# Altium schematic symbol library jlcpcb_2025_04_capacitors_extended_0402.schlib: 3594 symbols (part 15 of 20)
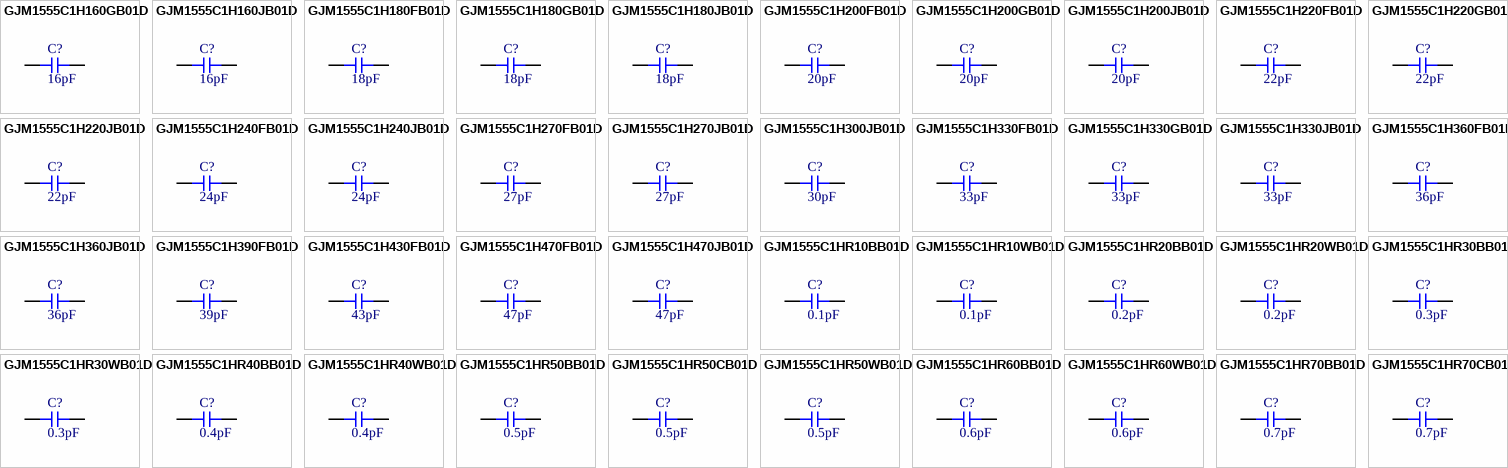
[diagram p103: symbols GJM1555C1H160GB01D to GJM1555C1HR70CB01D]

## GJM1555C1HR70CB01D
designator C?  Capacitance: 0.7pF  (hidden comment: *)
Capacitor, Ceramic (MLCC), 0.7pF, 50V, C0G, SMD 0402; Manufacturer: Murata Electronics; Manufacturer Part Number: GJM1555C1HR70CB01D; Package Size: 0402; JLCPCB Basic Part: No; JLCPCB Part Number: C344021; Supplier 1: LCSC; Category: Capacitors - MLCC; Supplier Part Number 1: C344021; Voltage Rating: 50V; Temperature Coefficient: C0G; RoHS: Yes; ComponentLink1Description: Datasheet; ComponentLink1URL: https://wmsc.lcsc.com/wmsc/upload/file/pdf/v2/lcsc/1912111437_Murata-Electronics-GJM1555C1HR70CB01D_C344021.pdf; ComponentLink2Description: JLCPCB Part URL; ComponentLink2URL: https://jlcpcb.com/partdetail/C344021; ComponentLink3Description: LCSC Part URL; ComponentLink3URL: https://lcsc.com/product-detail/Multilayer-Ceramic-Capacitors-MLCC---SMD-SMT_Murata-Electronics-Murata-Electronics-GJM1555C1HR70CB01D_C344021.html
footprint CAP-0402 (0402 (1005M) Capacitor)
pins: 1, 2

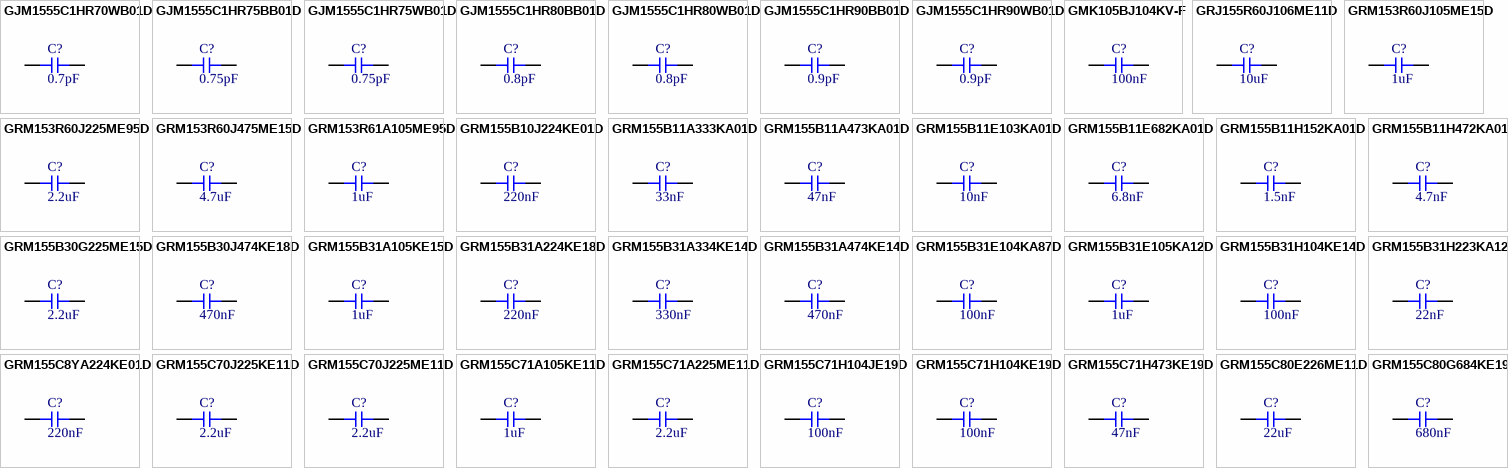
[diagram p65: symbols GJM1555C1HR70WB01D to GRM155C80G684KE19D]

## GJM1555C1HR70WB01D
designator C?  Capacitance: 0.7pF  (hidden comment: *)
Capacitor, Ceramic (MLCC), 0.7pF, 50V, C0G, SMD 0402; Manufacturer: Murata Electronics; Manufacturer Part Number: GJM1555C1HR70WB01D; Package Size: 0402; JLCPCB Basic Part: No; JLCPCB Part Number: C397301; Supplier 1: LCSC; Category: Capacitors - MLCC; Supplier Part Number 1: C397301; Voltage Rating: 50V; Temperature Coefficient: C0G; RoHS: Yes; ComponentLink1Description: Datasheet; ComponentLink1URL: https://wmsc.lcsc.com/wmsc/upload/file/pdf/v2/lcsc/1912111437_Murata-Electronics-GJM1555C1HR70WB01D_C397301.pdf; ComponentLink2Description: JLCPCB Part URL; ComponentLink2URL: https://jlcpcb.com/partdetail/C397301; ComponentLink3Description: LCSC Part URL; ComponentLink3URL: https://lcsc.com/product-detail/Multilayer-Ceramic-Capacitors-MLCC---SMD-SMT_Murata-Electronics-Murata-Electronics-GJM1555C1HR70WB01D_C397301.html
footprint CAP-0402 (0402 (1005M) Capacitor)
pins: 1, 2

## GJM1555C1HR75BB01D
designator C?  Capacitance: 0.75pF  (hidden comment: *)
Capacitor, Ceramic (MLCC), 0.75pF, 50V, C0G, SMD 0402; Manufacturer: Murata Electronics; Manufacturer Part Number: GJM1555C1HR75BB01D; Package Size: 0402; JLCPCB Basic Part: No; JLCPCB Part Number: C2931057; Supplier 1: LCSC; Category: Capacitors - MLCC; Supplier Part Number 1: C2931057; Voltage Rating: 50V; Temperature Coefficient: C0G; RoHS: Yes; ComponentLink1Description: Datasheet; ComponentLink1URL: https://wmsc.lcsc.com/wmsc/upload/file/pdf/v2/lcsc/2202161830_Murata-Electronics-GJM1555C1HR75BB01D_C2931057.pdf; ComponentLink2Description: JLCPCB Part URL; ComponentLink2URL: https://jlcpcb.com/partdetail/C2931057; ComponentLink3Description: LCSC Part URL; ComponentLink3URL: https://lcsc.com/product-detail/Multilayer-Ceramic-Capacitors-MLCC---SMD-SMT_Murata-Electronics-Murata-Electronics-GJM1555C1HR75BB01D_C2931057.html
footprint CAP-0402 (0402 (1005M) Capacitor)
pins: 1, 2

## GJM1555C1HR75WB01D
designator C?  Capacitance: 0.75pF  (hidden comment: *)
Capacitor, Ceramic (MLCC), 0.75pF, 50V, C0G, SMD 0402; Manufacturer: Murata Electronics; Manufacturer Part Number: GJM1555C1HR75WB01D; Package Size: 0402; JLCPCB Basic Part: No; JLCPCB Part Number: C76914; Supplier 1: LCSC; Category: Capacitors - MLCC; Supplier Part Number 1: C76914; Voltage Rating: 50V; Temperature Coefficient: C0G; RoHS: Yes; ComponentLink1Description: Datasheet; ComponentLink1URL: https://wmsc.lcsc.com/wmsc/upload/file/pdf/v2/lcsc/1811081611_Murata-Electronics-GJM1555C1HR75WB01D_C76914.pdf; ComponentLink2Description: JLCPCB Part URL; ComponentLink2URL: https://jlcpcb.com/partdetail/C76914; ComponentLink3Description: LCSC Part URL; ComponentLink3URL: https://lcsc.com/product-detail/Multilayer-Ceramic-Capacitors-MLCC---SMD-SMT_Murata-Electronics-Murata-Electronics-GJM1555C1HR75WB01D_C76914.html
footprint CAP-0402 (0402 (1005M) Capacitor)
pins: 1, 2

## GJM1555C1HR80BB01D
designator C?  Capacitance: 0.8pF  (hidden comment: *)
Capacitor, Ceramic (MLCC), 0.8pF, 50V, C0G, SMD 0402; Manufacturer: Murata Electronics; Manufacturer Part Number: GJM1555C1HR80BB01D; Package Size: 0402; JLCPCB Basic Part: No; JLCPCB Part Number: C76915; Supplier 1: LCSC; Category: Capacitors - MLCC; Supplier Part Number 1: C76915; Voltage Rating: 50V; Temperature Coefficient: C0G; RoHS: Yes; ComponentLink1Description: Datasheet; ComponentLink1URL: https://wmsc.lcsc.com/wmsc/upload/file/pdf/v2/lcsc/1811081610_Murata-Electronics-GJM1555C1HR80BB01D_C76915.pdf; ComponentLink2Description: JLCPCB Part URL; ComponentLink2URL: https://jlcpcb.com/partdetail/C76915; ComponentLink3Description: LCSC Part URL; ComponentLink3URL: https://lcsc.com/product-detail/Multilayer-Ceramic-Capacitors-MLCC---SMD-SMT_Murata-Electronics-Murata-Electronics-GJM1555C1HR80BB01D_C76915.html
footprint CAP-0402 (0402 (1005M) Capacitor)
pins: 1, 2

## GJM1555C1HR80WB01D
designator C?  Capacitance: 0.8pF  (hidden comment: *)
Capacitor, Ceramic (MLCC), 0.8pF, 50V, C0G, SMD 0402; Manufacturer: Murata Electronics; Manufacturer Part Number: GJM1555C1HR80WB01D; Package Size: 0402; JLCPCB Basic Part: No; JLCPCB Part Number: C88902; Supplier 1: LCSC; Category: Capacitors - MLCC; Supplier Part Number 1: C88902; Voltage Rating: 50V; Temperature Coefficient: C0G; RoHS: Yes; ComponentLink1Description: Datasheet; ComponentLink1URL: https://wmsc.lcsc.com/wmsc/upload/file/pdf/v2/lcsc/2304140030_Murata-Electronics-GJM1555C1HR80WB01D_C88902.pdf; ComponentLink2Description: JLCPCB Part URL; ComponentLink2URL: https://jlcpcb.com/partdetail/C88902; ComponentLink3Description: LCSC Part URL; ComponentLink3URL: https://lcsc.com/product-detail/Multilayer-Ceramic-Capacitors-MLCC---SMD-SMT_Murata-Electronics-Murata-Electronics-GJM1555C1HR80WB01D_C88902.html
footprint CAP-0402 (0402 (1005M) Capacitor)
pins: 1, 2

## GJM1555C1HR90BB01D
designator C?  Capacitance: 0.9pF  (hidden comment: *)
Capacitor, Ceramic (MLCC), 0.9pF, null, null, SMD 0402; Manufacturer: Murata Electronics; Manufacturer Part Number: GJM1555C1HR90BB01D; Package Size: 0402; JLCPCB Basic Part: No; JLCPCB Part Number: C882556; Supplier 1: LCSC; Category: Capacitors - MLCC; Supplier Part Number 1: C882556; Voltage Rating: null; Temperature Coefficient: null; RoHS: Yes; ComponentLink1Description: Datasheet; ComponentLink1URL: https://wmsc.lcsc.com/wmsc/upload/file/pdf/v2/lcsc/2201242130_Murata-Electronics-GJM1555C1HR90BB01D_C882556.pdf; ComponentLink2Description: JLCPCB Part URL; ComponentLink2URL: https://jlcpcb.com/partdetail/C882556; ComponentLink3Description: LCSC Part URL; ComponentLink3URL: https://lcsc.com/product-detail/Multilayer-Ceramic-Capacitors-MLCC---SMD-SMT_Murata-Electronics-Murata-Electronics-GJM1555C1HR90BB01D_C882556.html
footprint CAP-0402 (0402 (1005M) Capacitor)
pins: 1, 2

## GJM1555C1HR90WB01D
designator C?  Capacitance: 0.9pF  (hidden comment: *)
Capacitor, Ceramic (MLCC), 0.9pF, 50V, C0G, SMD 0402; Manufacturer: Murata Electronics; Manufacturer Part Number: GJM1555C1HR90WB01D; Package Size: 0402; JLCPCB Basic Part: No; JLCPCB Part Number: C161350; Supplier 1: LCSC; Category: Capacitors - MLCC; Supplier Part Number 1: C161350; Voltage Rating: 50V; Temperature Coefficient: C0G; RoHS: Yes; ComponentLink1Description: Datasheet; ComponentLink1URL: https://wmsc.lcsc.com/wmsc/upload/file/pdf/v2/lcsc/1811081513_Murata-Electronics-GJM1555C1HR90WB01D_C161350.pdf; ComponentLink2Description: JLCPCB Part URL; ComponentLink2URL: https://jlcpcb.com/partdetail/C161350; ComponentLink3Description: LCSC Part URL; ComponentLink3URL: https://lcsc.com/product-detail/Multilayer-Ceramic-Capacitors-MLCC---SMD-SMT_Murata-Electronics-Murata-Electronics-GJM1555C1HR90WB01D_C161350.html
footprint CAP-0402 (0402 (1005M) Capacitor)
pins: 1, 2

## GMK105BJ104KV-F
designator C?  Capacitance: 100nF  (hidden comment: *)
Capacitor, Ceramic (MLCC), 100nF, ±10%, 35V, X5R, ±10%, SMD 0402; Manufacturer: Taiyo Yuden; Manufacturer Part Number: GMK105BJ104KV-F; Package Size: 0402; JLCPCB Basic Part: No; JLCPCB Part Number: C187828; Supplier 1: LCSC; Category: Capacitors - MLCC; Supplier Part Number 1: C187828; Tolerance: ±10%; Voltage Rating: 35V; Temperature Coefficient: X5R; RoHS: Yes; ComponentLink1Description: Datasheet; ComponentLink1URL: https://wmsc.lcsc.com/wmsc/upload/file/pdf/v2/lcsc/2211282300_Taiyo-Yuden-GMK105BJ104KV-F_C187828.pdf; ComponentLink2Description: JLCPCB Part URL; ComponentLink2URL: https://jlcpcb.com/partdetail/C187828; ComponentLink3Description: LCSC Part URL; ComponentLink3URL: https://lcsc.com/product-detail/Multilayer-Ceramic-Capacitors-MLCC---SMD-SMT_Taiyo-Yuden-Taiyo-Yuden-GMK105BJ104KV-F_C187828.html
footprint CAP-0402 (0402 (1005M) Capacitor)
pins: 1, 2

## GRJ155R60J106ME11D
designator C?  Capacitance: 10uF  (hidden comment: *)
Capacitor, Ceramic (MLCC), 10uF, ±20%, 6.3V, X5R, ±20%, SMD 0402; Manufacturer: Murata Electronics; Manufacturer Part Number: GRJ155R60J106ME11D; Package Size: 0402; JLCPCB Basic Part: No; JLCPCB Part Number: C469527; Supplier 1: LCSC; Category: Capacitors - MLCC; Supplier Part Number 1: C469527; Tolerance: ±20%; Voltage Rating: 6.3V; Temperature Coefficient: X5R; RoHS: Yes; ComponentLink1Description: Datasheet; ComponentLink1URL: https://wmsc.lcsc.com/wmsc/upload/file/pdf/v2/lcsc/2304140030_Murata-Electronics-GRJ155R60J106ME11D_C469527.pdf; ComponentLink2Description: JLCPCB Part URL; ComponentLink2URL: https://jlcpcb.com/partdetail/C469527; ComponentLink3Description: LCSC Part URL; ComponentLink3URL: https://lcsc.com/product-detail/Multilayer-Ceramic-Capacitors-MLCC---SMD-SMT_Murata-Electronics-Murata-Electronics-GRJ155R60J106ME11D_C469527.html
footprint CAP-0402 (0402 (1005M) Capacitor)
pins: 1, 2

## GRM153R60J105ME15D
designator C?  Capacitance: 1uF  (hidden comment: *)
Capacitor, Ceramic (MLCC), 1uF, ±20%, 6.3V, X5R, ±20%, SMD 0402; Manufacturer: Murata Electronics; Manufacturer Part Number: GRM153R60J105ME15D; Package Size: 0402; JLCPCB Basic Part: No; JLCPCB Part Number: C335107; Supplier 1: LCSC; Category: Capacitors - MLCC; Supplier Part Number 1: C335107; Tolerance: ±20%; Voltage Rating: 6.3V; Temperature Coefficient: X5R; RoHS: Yes; ComponentLink1Description: Datasheet; ComponentLink1URL: https://wmsc.lcsc.com/wmsc/upload/file/pdf/v2/lcsc/2304140030_Murata-Electronics-GRM153R60J105ME15D_C335107.pdf; ComponentLink2Description: JLCPCB Part URL; ComponentLink2URL: https://jlcpcb.com/partdetail/C335107; ComponentLink3Description: LCSC Part URL; ComponentLink3URL: https://lcsc.com/product-detail/Multilayer-Ceramic-Capacitors-MLCC---SMD-SMT_Murata-Electronics-Murata-Electronics-GRM153R60J105ME15D_C335107.html
footprint CAP-0402 (0402 (1005M) Capacitor)
pins: 1, 2

## GRM153R60J225ME95D
designator C?  Capacitance: 2.2uF  (hidden comment: *)
Capacitor, Ceramic (MLCC), 2.2uF, ±20%, 6.3V, X5R, ±20%, SMD 0402; Manufacturer: Murata Electronics; Manufacturer Part Number: GRM153R60J225ME95D; Package Size: 0402; JLCPCB Basic Part: No; JLCPCB Part Number: C76944; Supplier 1: LCSC; Category: Capacitors - MLCC; Supplier Part Number 1: C76944; Tolerance: ±20%; Voltage Rating: 6.3V; Temperature Coefficient: X5R; RoHS: Yes; ComponentLink1Description: Datasheet; ComponentLink1URL: https://wmsc.lcsc.com/wmsc/upload/file/pdf/v2/lcsc/1811081610_Murata-Electronics-GRM153R60J225ME95D_C76944.pdf; ComponentLink2Description: JLCPCB Part URL; ComponentLink2URL: https://jlcpcb.com/partdetail/C76944; ComponentLink3Description: LCSC Part URL; ComponentLink3URL: https://lcsc.com/product-detail/Multilayer-Ceramic-Capacitors-MLCC---SMD-SMT_Murata-Electronics-Murata-Electronics-GRM153R60J225ME95D_C76944.html
footprint CAP-0402 (0402 (1005M) Capacitor)
pins: 1, 2

## GRM153R60J475ME15D
designator C?  Capacitance: 4.7uF  (hidden comment: *)
Capacitor, Ceramic (MLCC), 4.7uF, ±20%, 6.3V, X5R, ±20%, SMD 0402; Manufacturer: Murata Electronics; Manufacturer Part Number: GRM153R60J475ME15D; Package Size: 0402; JLCPCB Basic Part: No; JLCPCB Part Number: C335104; Supplier 1: LCSC; Category: Capacitors - MLCC; Supplier Part Number 1: C335104; Tolerance: ±20%; Voltage Rating: 6.3V; Temperature Coefficient: X5R; RoHS: Yes; ComponentLink1Description: Datasheet; ComponentLink1URL: https://wmsc.lcsc.com/wmsc/upload/file/pdf/v2/lcsc/2304140030_Murata-Electronics-GRM153R60J475ME15D_C335104.pdf; ComponentLink2Description: JLCPCB Part URL; ComponentLink2URL: https://jlcpcb.com/partdetail/C335104; ComponentLink3Description: LCSC Part URL; ComponentLink3URL: https://lcsc.com/product-detail/Multilayer-Ceramic-Capacitors-MLCC---SMD-SMT_Murata-Electronics-Murata-Electronics-GRM153R60J475ME15D_C335104.html
footprint CAP-0402 (0402 (1005M) Capacitor)
pins: 1, 2

## GRM153R61A105ME95D
designator C?  Capacitance: 1uF  (hidden comment: *)
Capacitor, Ceramic (MLCC), 1uF, ±20%, 10V, X5R, ±20%, SMD 0402; Manufacturer: Murata Electronics; Manufacturer Part Number: GRM153R61A105ME95D; Package Size: 0402; JLCPCB Basic Part: No; JLCPCB Part Number: C2167216; Supplier 1: LCSC; Category: Capacitors - MLCC; Supplier Part Number 1: C2167216; Tolerance: ±20%; Voltage Rating: 10V; Temperature Coefficient: X5R; RoHS: Yes; ComponentLink1Description: Datasheet; ComponentLink1URL: https://wmsc.lcsc.com/wmsc/upload/file/pdf/v2/lcsc/2202040230_Murata-Electronics-GRM153R61A105ME95D_C2167216.pdf; ComponentLink2Description: JLCPCB Part URL; ComponentLink2URL: https://jlcpcb.com/partdetail/C2167216; ComponentLink3Description: LCSC Part URL; ComponentLink3URL: https://lcsc.com/product-detail/Multilayer-Ceramic-Capacitors-MLCC---SMD-SMT_Murata-Electronics-Murata-Electronics-GRM153R61A105ME95D_C2167216.html
footprint CAP-0402 (0402 (1005M) Capacitor)
pins: 1, 2

## GRM155B10J224KE01D
designator C?  Capacitance: 220nF  (hidden comment: *)
Capacitor, Ceramic (MLCC), 220nF, ±10%, 6.3V, B, ±10%, SMD 0402; Manufacturer: Murata Electronics; Manufacturer Part Number: GRM155B10J224KE01D; Package Size: 0402; JLCPCB Basic Part: No; JLCPCB Part Number: C162147; Supplier 1: LCSC; Category: Capacitors - MLCC; Supplier Part Number 1: C162147; Tolerance: ±10%; Voltage Rating: 6.3V; Temperature Coefficient: B; RoHS: Yes; ComponentLink1Description: Datasheet; ComponentLink1URL: https://wmsc.lcsc.com/wmsc/upload/file/pdf/v2/lcsc/1912111437_Murata-Electronics-GRM155B10J224KE01D_C162147.pdf; ComponentLink2Description: JLCPCB Part URL; ComponentLink2URL: https://jlcpcb.com/partdetail/C162147; ComponentLink3Description: LCSC Part URL; ComponentLink3URL: https://lcsc.com/product-detail/Multilayer-Ceramic-Capacitors-MLCC---SMD-SMT_Murata-Electronics-Murata-Electronics-GRM155B10J224KE01D_C162147.html
footprint CAP-0402 (0402 (1005M) Capacitor)
pins: 1, 2

## GRM155B11A333KA01D
designator C?  Capacitance: 33nF  (hidden comment: *)
Capacitor, Ceramic (MLCC), 33nF, ±10%, 10V, B, ±10%, SMD 0402; Manufacturer: Murata Electronics; Manufacturer Part Number: GRM155B11A333KA01D; Package Size: 0402; JLCPCB Basic Part: No; JLCPCB Part Number: C397300; Supplier 1: LCSC; Category: Capacitors - MLCC; Supplier Part Number 1: C397300; Tolerance: ±10%; Voltage Rating: 10V; Temperature Coefficient: B; RoHS: Yes; ComponentLink1Description: Datasheet; ComponentLink1URL: https://wmsc.lcsc.com/wmsc/upload/file/pdf/v2/lcsc/1912111437_Murata-Electronics-GRM155B11A333KA01D_C397300.pdf; ComponentLink2Description: JLCPCB Part URL; ComponentLink2URL: https://jlcpcb.com/partdetail/C397300; ComponentLink3Description: LCSC Part URL; ComponentLink3URL: https://lcsc.com/product-detail/Multilayer-Ceramic-Capacitors-MLCC---SMD-SMT_Murata-Electronics-Murata-Electronics-GRM155B11A333KA01D_C397300.html
footprint CAP-0402 (0402 (1005M) Capacitor)
pins: 1, 2

## GRM155B11A473KA01D
designator C?  Capacitance: 47nF  (hidden comment: *)
Capacitor, Ceramic (MLCC), 47nF, ±10%, 10V, B, ±10%, SMD 0402; Manufacturer: Murata Electronics; Manufacturer Part Number: GRM155B11A473KA01D; Package Size: 0402; JLCPCB Basic Part: No; JLCPCB Part Number: C397296; Supplier 1: LCSC; Category: Capacitors - MLCC; Supplier Part Number 1: C397296; Tolerance: ±10%; Voltage Rating: 10V; Temperature Coefficient: B; RoHS: Yes; ComponentLink1Description: Datasheet; ComponentLink1URL: https://wmsc.lcsc.com/wmsc/upload/file/pdf/v2/lcsc/1912111437_Murata-Electronics-GRM155B11A473KA01D_C397296.pdf; ComponentLink2Description: JLCPCB Part URL; ComponentLink2URL: https://jlcpcb.com/partdetail/C397296; ComponentLink3Description: LCSC Part URL; ComponentLink3URL: https://lcsc.com/product-detail/Multilayer-Ceramic-Capacitors-MLCC---SMD-SMT_Murata-Electronics-Murata-Electronics-GRM155B11A473KA01D_C397296.html
footprint CAP-0402 (0402 (1005M) Capacitor)
pins: 1, 2

## GRM155B11E103KA01D
designator C?  Capacitance: 10nF  (hidden comment: *)
Capacitor, Ceramic (MLCC), 10nF, ±10%, 25V, B, ±10%, SMD 0402; Manufacturer: Murata Electronics; Manufacturer Part Number: GRM155B11E103KA01D; Package Size: 0402; JLCPCB Basic Part: No; JLCPCB Part Number: C85947; Supplier 1: LCSC; Category: Capacitors - MLCC; Supplier Part Number 1: C85947; Tolerance: ±10%; Voltage Rating: 25V; Temperature Coefficient: B; RoHS: Yes; ComponentLink1Description: Datasheet; ComponentLink1URL: https://wmsc.lcsc.com/wmsc/upload/file/pdf/v2/lcsc/2304140030_Murata-Electronics-GRM155B11E103KA01D_C85947.pdf; ComponentLink2Description: JLCPCB Part URL; ComponentLink2URL: https://jlcpcb.com/partdetail/C85947; ComponentLink3Description: LCSC Part URL; ComponentLink3URL: https://lcsc.com/product-detail/Multilayer-Ceramic-Capacitors-MLCC---SMD-SMT_Murata-Electronics-Murata-Electronics-GRM155B11E103KA01D_C85947.html
footprint CAP-0402 (0402 (1005M) Capacitor)
pins: 1, 2

## GRM155B11E682KA01D
designator C?  Capacitance: 6.8nF  (hidden comment: *)
Capacitor, Ceramic (MLCC), 6.8nF, ±10%, 25V, B, ±10%, SMD 0402; Manufacturer: Murata Electronics; Manufacturer Part Number: GRM155B11E682KA01D; Package Size: 0402; JLCPCB Basic Part: No; JLCPCB Part Number: C471372; Supplier 1: LCSC; Category: Capacitors - MLCC; Supplier Part Number 1: C471372; Tolerance: ±10%; Voltage Rating: 25V; Temperature Coefficient: B; RoHS: Yes; ComponentLink1Description: Datasheet; ComponentLink1URL: https://wmsc.lcsc.com/wmsc/upload/file/pdf/v2/lcsc/2308111634_Murata-Electronics-GRM155B11E682KA01D_C471372.pdf; ComponentLink2Description: JLCPCB Part URL; ComponentLink2URL: https://jlcpcb.com/partdetail/C471372; ComponentLink3Description: LCSC Part URL; ComponentLink3URL: https://lcsc.com/product-detail/Multilayer-Ceramic-Capacitors-MLCC---SMD-SMT_Murata-Electronics-Murata-Electronics-GRM155B11E682KA01D_C471372.html
footprint CAP-0402 (0402 (1005M) Capacitor)
pins: 1, 2

## GRM155B11H152KA01D
designator C?  Capacitance: 1.5nF  (hidden comment: *)
Capacitor, Ceramic (MLCC), 1.5nF, ±10%, 50V, ±10%, SMD 0402; Manufacturer: Murata Electronics; Manufacturer Part Number: GRM155B11H152KA01D; Package Size: 0402; JLCPCB Basic Part: No; JLCPCB Part Number: C162152; Supplier 1: LCSC; Category: Capacitors - MLCC; Supplier Part Number 1: C162152; Tolerance: ±10%; Voltage Rating: 50V; RoHS: Yes; ComponentLink1Description: Datasheet; ComponentLink1URL: https://wmsc.lcsc.com/wmsc/upload/file/pdf/v2/lcsc/2109071830_Murata-Electronics-GRM155B11H152KA01D_C162152.pdf; ComponentLink2Description: JLCPCB Part URL; ComponentLink2URL: https://jlcpcb.com/partdetail/C162152; ComponentLink3Description: LCSC Part URL; ComponentLink3URL: https://lcsc.com/product-detail/Multilayer-Ceramic-Capacitors-MLCC---SMD-SMT_Murata-Electronics-Murata-Electronics-GRM155B11H152KA01D_C162152.html
footprint CAP-0402 (0402 (1005M) Capacitor)
pins: 1, 2

## GRM155B11H472KA01D
designator C?  Capacitance: 4.7nF  (hidden comment: *)
Capacitor, Ceramic (MLCC), 4.7nF, ±10%, 50V, B, ±10%, SMD 0402; Manufacturer: Murata Electronics; Manufacturer Part Number: GRM155B11H472KA01D; Package Size: 0402; JLCPCB Basic Part: No; JLCPCB Part Number: C237394; Supplier 1: LCSC; Category: Capacitors - MLCC; Supplier Part Number 1: C237394; Tolerance: ±10%; Voltage Rating: 50V; Temperature Coefficient: B; RoHS: Yes; ComponentLink1Description: Datasheet; ComponentLink1URL: https://wmsc.lcsc.com/wmsc/upload/file/pdf/v2/lcsc/2109071830_Murata-Electronics-GRM155B11H472KA01D_C237394.pdf; ComponentLink2Description: JLCPCB Part URL; ComponentLink2URL: https://jlcpcb.com/partdetail/C237394; ComponentLink3Description: LCSC Part URL; ComponentLink3URL: https://lcsc.com/product-detail/Multilayer-Ceramic-Capacitors-MLCC---SMD-SMT_Murata-Electronics-Murata-Electronics-GRM155B11H472KA01D_C237394.html
footprint CAP-0402 (0402 (1005M) Capacitor)
pins: 1, 2

## GRM155B30G225ME15D
designator C?  Capacitance: 2.2uF  (hidden comment: *)
Capacitor, Ceramic (MLCC), 2.2uF, ±20%, 4V, B, ±20%, SMD 0402; Manufacturer: Murata Electronics; Manufacturer Part Number: GRM155B30G225ME15D; Package Size: 0402; JLCPCB Basic Part: No; JLCPCB Part Number: C415544; Supplier 1: LCSC; Category: Capacitors - MLCC; Supplier Part Number 1: C415544; Tolerance: ±20%; Voltage Rating: 4V; Temperature Coefficient: B; RoHS: Yes; ComponentLink1Description: Datasheet; ComponentLink1URL: https://wmsc.lcsc.com/wmsc/upload/file/pdf/v2/lcsc/2304140030_Murata-Electronics-GRM155B30G225ME15D_C415544.pdf; ComponentLink2Description: JLCPCB Part URL; ComponentLink2URL: https://jlcpcb.com/partdetail/C415544; ComponentLink3Description: LCSC Part URL; ComponentLink3URL: https://lcsc.com/product-detail/Multilayer-Ceramic-Capacitors-MLCC---SMD-SMT_Murata-Electronics-Murata-Electronics-GRM155B30G225ME15D_C415544.html
footprint CAP-0402 (0402 (1005M) Capacitor)
pins: 1, 2

## GRM155B30J474KE18D
designator C?  Capacitance: 470nF  (hidden comment: *)
Capacitor, Ceramic (MLCC), 470nF, ±10%, 6.3V, B, ±10%, SMD 0402; Manufacturer: Murata Electronics; Manufacturer Part Number: GRM155B30J474KE18D; Package Size: 0402; JLCPCB Basic Part: No; JLCPCB Part Number: C524565; Supplier 1: LCSC; Category: Capacitors - MLCC; Supplier Part Number 1: C524565; Tolerance: ±10%; Voltage Rating: 6.3V; Temperature Coefficient: B; RoHS: Yes; ComponentLink1Description: Datasheet; ComponentLink1URL: https://wmsc.lcsc.com/wmsc/upload/file/pdf/v2/lcsc/2008191834_Murata-Electronics-GRM155B30J474KE18D_C524565.pdf; ComponentLink2Description: JLCPCB Part URL; ComponentLink2URL: https://jlcpcb.com/partdetail/C524565; ComponentLink3Description: LCSC Part URL; ComponentLink3URL: https://lcsc.com/product-detail/Multilayer-Ceramic-Capacitors-MLCC---SMD-SMT_Murata-Electronics-Murata-Electronics-GRM155B30J474KE18D_C524565.html
footprint CAP-0402 (0402 (1005M) Capacitor)
pins: 1, 2

## GRM155B31A105KE15D
designator C?  Capacitance: 1uF  (hidden comment: *)
Capacitor, Ceramic (MLCC), 1uF, ±10%, 10V, B, ±10%, SMD 0402; Manufacturer: Murata Electronics; Manufacturer Part Number: GRM155B31A105KE15D; Package Size: 0402; JLCPCB Basic Part: No; JLCPCB Part Number: C162154; Supplier 1: LCSC; Category: Capacitors - MLCC; Supplier Part Number 1: C162154; Tolerance: ±10%; Voltage Rating: 10V; Temperature Coefficient: B; RoHS: Yes; ComponentLink1Description: Datasheet; ComponentLink1URL: https://wmsc.lcsc.com/wmsc/upload/file/pdf/v2/lcsc/2201242300_Murata-Electronics-GRM155B31A105KE15D_C162154.pdf; ComponentLink2Description: JLCPCB Part URL; ComponentLink2URL: https://jlcpcb.com/partdetail/C162154; ComponentLink3Description: LCSC Part URL; ComponentLink3URL: https://lcsc.com/product-detail/Multilayer-Ceramic-Capacitors-MLCC---SMD-SMT_Murata-Electronics-Murata-Electronics-GRM155B31A105KE15D_C162154.html
footprint CAP-0402 (0402 (1005M) Capacitor)
pins: 1, 2

## GRM155B31A224KE18D
designator C?  Capacitance: 220nF  (hidden comment: *)
Capacitor, Ceramic (MLCC), 220nF, ±10%, ±10%, SMD 0402; Manufacturer: Murata Electronics; Manufacturer Part Number: GRM155B31A224KE18D; Package Size: 0402; JLCPCB Basic Part: No; JLCPCB Part Number: C576448; Supplier 1: LCSC; Category: Capacitors - MLCC; Supplier Part Number 1: C576448; Tolerance: ±10%; RoHS: Yes; ComponentLink1Description: Datasheet; ComponentLink1URL: https://wmsc.lcsc.com/wmsc/upload/file/pdf/v2/lcsc/2201131030_Murata-Electronics-GRM155B31A224KE18D_C576448.pdf; ComponentLink2Description: JLCPCB Part URL; ComponentLink2URL: https://jlcpcb.com/partdetail/C576448; ComponentLink3Description: LCSC Part URL; ComponentLink3URL: https://lcsc.com/product-detail/Multilayer-Ceramic-Capacitors-MLCC---SMD-SMT_Murata-Electronics-Murata-Electronics-GRM155B31A224KE18D_C576448.html
footprint CAP-0402 (0402 (1005M) Capacitor)
pins: 1, 2

## GRM155B31A334KE14D
designator C?  Capacitance: 330nF  (hidden comment: *)
Capacitor, Ceramic (MLCC), 330nF, ±10%, 10V, B, ±10%, SMD 0402; Manufacturer: Murata Electronics; Manufacturer Part Number: GRM155B31A334KE14D; Package Size: 0402; JLCPCB Basic Part: No; JLCPCB Part Number: C528972; Supplier 1: LCSC; Category: Capacitors - MLCC; Supplier Part Number 1: C528972; Tolerance: ±10%; Voltage Rating: 10V; Temperature Coefficient: B; RoHS: Yes; ComponentLink1Description: Datasheet; ComponentLink1URL: https://wmsc.lcsc.com/wmsc/upload/file/pdf/v2/lcsc/2005141808_Murata-Electronics-GRM155B31A334KE14D_C528972.pdf; ComponentLink2Description: JLCPCB Part URL; ComponentLink2URL: https://jlcpcb.com/partdetail/C528972; ComponentLink3Description: LCSC Part URL; ComponentLink3URL: https://lcsc.com/product-detail/Multilayer-Ceramic-Capacitors-MLCC---SMD-SMT_Murata-Electronics-Murata-Electronics-GRM155B31A334KE14D_C528972.html
footprint CAP-0402 (0402 (1005M) Capacitor)
pins: 1, 2

## GRM155B31A474KE14D
designator C?  Capacitance: 470nF  (hidden comment: *)
Capacitor, Ceramic (MLCC), 470nF, ±10%, 10V, B, ±10%, SMD 0402; Manufacturer: Murata Electronics; Manufacturer Part Number: GRM155B31A474KE14D; Package Size: 0402; JLCPCB Basic Part: No; JLCPCB Part Number: C527993; Supplier 1: LCSC; Category: Capacitors - MLCC; Supplier Part Number 1: C527993; Tolerance: ±10%; Voltage Rating: 10V; Temperature Coefficient: B; RoHS: Yes; ComponentLink1Description: Datasheet; ComponentLink1URL: https://wmsc.lcsc.com/wmsc/upload/file/pdf/v2/lcsc/2006242133_Murata-Electronics-GRM155B31A474KE14D_C527993.pdf; ComponentLink2Description: JLCPCB Part URL; ComponentLink2URL: https://jlcpcb.com/partdetail/C527993; ComponentLink3Description: LCSC Part URL; ComponentLink3URL: https://lcsc.com/product-detail/Multilayer-Ceramic-Capacitors-MLCC---SMD-SMT_Murata-Electronics-Murata-Electronics-GRM155B31A474KE14D_C527993.html
footprint CAP-0402 (0402 (1005M) Capacitor)
pins: 1, 2

## GRM155B31E104KA87D
designator C?  Capacitance: 100nF  (hidden comment: *)
Capacitor, Ceramic (MLCC), 100nF, ±10%, ±10%, SMD 0402; Manufacturer: Murata Electronics; Manufacturer Part Number: GRM155B31E104KA87D; Package Size: 0402; JLCPCB Basic Part: No; JLCPCB Part Number: C913620; Supplier 1: LCSC; Category: Capacitors - MLCC; Supplier Part Number 1: C913620; Tolerance: ±10%; RoHS: Yes; ComponentLink1Description: Datasheet; ComponentLink1URL: https://wmsc.lcsc.com/wmsc/upload/file/pdf/v2/lcsc/2201131300_Murata-Electronics-GRM155B31E104KA87D_C913620.pdf; ComponentLink2Description: JLCPCB Part URL; ComponentLink2URL: https://jlcpcb.com/partdetail/C913620; ComponentLink3Description: LCSC Part URL; ComponentLink3URL: https://lcsc.com/product-detail/Multilayer-Ceramic-Capacitors-MLCC---SMD-SMT_Murata-Electronics-Murata-Electronics-GRM155B31E104KA87D_C913620.html
footprint CAP-0402 (0402 (1005M) Capacitor)
pins: 1, 2

## GRM155B31E105KA12D
designator C?  Capacitance: 1uF  (hidden comment: *)
Capacitor, Ceramic (MLCC), 1uF, ±10%, ±10%, SMD 0402; Manufacturer: Murata Electronics; Manufacturer Part Number: GRM155B31E105KA12D; Package Size: 0402; JLCPCB Basic Part: No; JLCPCB Part Number: C913556; Supplier 1: LCSC; Category: Capacitors - MLCC; Supplier Part Number 1: C913556; Tolerance: ±10%; RoHS: Yes; ComponentLink1Description: Datasheet; ComponentLink1URL: https://wmsc.lcsc.com/wmsc/upload/file/pdf/v2/lcsc/2201131300_Murata-Electronics-GRM155B31E105KA12D_C913556.pdf; ComponentLink2Description: JLCPCB Part URL; ComponentLink2URL: https://jlcpcb.com/partdetail/C913556; ComponentLink3Description: LCSC Part URL; ComponentLink3URL: https://lcsc.com/product-detail/Multilayer-Ceramic-Capacitors-MLCC---SMD-SMT_Murata-Electronics-Murata-Electronics-GRM155B31E105KA12D_C913556.html
footprint CAP-0402 (0402 (1005M) Capacitor)
pins: 1, 2

## GRM155B31H104KE14D
designator C?  Capacitance: 100nF  (hidden comment: *)
Capacitor, Ceramic (MLCC), 100nF, ±10%, 50V, B, ±10%, SMD 0402; Manufacturer: Murata Electronics; Manufacturer Part Number: GRM155B31H104KE14D; Package Size: 0402; JLCPCB Basic Part: No; JLCPCB Part Number: C85953; Supplier 1: LCSC; Category: Capacitors - MLCC; Supplier Part Number 1: C85953; Tolerance: ±10%; Voltage Rating: 50V; Temperature Coefficient: B; RoHS: Yes; ComponentLink1Description: Datasheet; ComponentLink1URL: https://wmsc.lcsc.com/wmsc/upload/file/pdf/v2/lcsc/2304140030_Murata-Electronics-GRM155B31H104KE14D_C85953.pdf; ComponentLink2Description: JLCPCB Part URL; ComponentLink2URL: https://jlcpcb.com/partdetail/C85953; ComponentLink3Description: LCSC Part URL; ComponentLink3URL: https://lcsc.com/product-detail/Multilayer-Ceramic-Capacitors-MLCC---SMD-SMT_Murata-Electronics-Murata-Electronics-GRM155B31H104KE14D_C85953.html
footprint CAP-0402 (0402 (1005M) Capacitor)
pins: 1, 2

## GRM155B31H223KA12D
designator C?  Capacitance: 22nF  (hidden comment: *)
Capacitor, Ceramic (MLCC), 22nF, ±10%, 50V, B, ±10%, SMD 0402; Manufacturer: Murata Electronics; Manufacturer Part Number: GRM155B31H223KA12D; Package Size: 0402; JLCPCB Basic Part: No; JLCPCB Part Number: C521247; Supplier 1: LCSC; Category: Capacitors - MLCC; Supplier Part Number 1: C521247; Tolerance: ±10%; Voltage Rating: 50V; Temperature Coefficient: B; RoHS: Yes; ComponentLink1Description: Datasheet; ComponentLink1URL: https://wmsc.lcsc.com/wmsc/upload/file/pdf/v2/lcsc/2005071506_Murata-Electronics-GRM155B31H223KA12D_C521247.pdf; ComponentLink2Description: JLCPCB Part URL; ComponentLink2URL: https://jlcpcb.com/partdetail/C521247; ComponentLink3Description: LCSC Part URL; ComponentLink3URL: https://lcsc.com/product-detail/Multilayer-Ceramic-Capacitors-MLCC---SMD-SMT_Murata-Electronics-Murata-Electronics-GRM155B31H223KA12D_C521247.html
footprint CAP-0402 (0402 (1005M) Capacitor)
pins: 1, 2

## GRM155C8YA224KE01D
designator C?  Capacitance: 220nF  (hidden comment: *)
Capacitor, Ceramic (MLCC), 220nF, ±10%, 35V, X6S, ±10%, SMD 0402; Manufacturer: Murata Electronics; Manufacturer Part Number: GRM155C8YA224KE01D; Package Size: 0402; JLCPCB Basic Part: No; JLCPCB Part Number: C162164; Supplier 1: LCSC; Category: Capacitors - MLCC; Supplier Part Number 1: C162164; Tolerance: ±10%; Voltage Rating: 35V; Temperature Coefficient: X6S; RoHS: Yes; ComponentLink1Description: Datasheet; ComponentLink1URL: https://wmsc.lcsc.com/wmsc/upload/file/pdf/v2/lcsc/1811081512_Murata-Electronics-GRM155C8YA224KE01D_C162164.pdf; ComponentLink2Description: JLCPCB Part URL; ComponentLink2URL: https://jlcpcb.com/partdetail/C162164; ComponentLink3Description: LCSC Part URL; ComponentLink3URL: https://lcsc.com/product-detail/Multilayer-Ceramic-Capacitors-MLCC---SMD-SMT_Murata-Electronics-Murata-Electronics-GRM155C8YA224KE01D_C162164.html
footprint CAP-0402 (0402 (1005M) Capacitor)
pins: 1, 2

## GRM155C70J225KE11D
designator C?  Capacitance: 2.2uF  (hidden comment: *)
Capacitor, Ceramic (MLCC), 2.2uF, ±10%, 6.3V, X7S, ±10%, SMD 0402; Manufacturer: Murata Electronics; Manufacturer Part Number: GRM155C70J225KE11D; Package Size: 0402; JLCPCB Basic Part: No; JLCPCB Part Number: C368595; Supplier 1: LCSC; Category: Capacitors - MLCC; Supplier Part Number 1: C368595; Tolerance: ±10%; Voltage Rating: 6.3V; Temperature Coefficient: X7S; RoHS: Yes; ComponentLink1Description: Datasheet; ComponentLink1URL: https://wmsc.lcsc.com/wmsc/upload/file/pdf/v2/lcsc/1912111437_Murata-Electronics-GRM155C70J225KE11D_C368595.pdf; ComponentLink2Description: JLCPCB Part URL; ComponentLink2URL: https://jlcpcb.com/partdetail/C368595; ComponentLink3Description: LCSC Part URL; ComponentLink3URL: https://lcsc.com/product-detail/Multilayer-Ceramic-Capacitors-MLCC---SMD-SMT_Murata-Electronics-Murata-Electronics-GRM155C70J225KE11D_C368595.html
footprint CAP-0402 (0402 (1005M) Capacitor)
pins: 1, 2

## GRM155C70J225ME11D
designator C?  Capacitance: 2.2uF  (hidden comment: *)
Capacitor, Ceramic (MLCC), 2.2uF, ±20%, 6.3V, X7S, ±20%, SMD 0402; Manufacturer: Murata Electronics; Manufacturer Part Number: GRM155C70J225ME11D; Package Size: 0402; JLCPCB Basic Part: No; JLCPCB Part Number: C710862; Supplier 1: LCSC; Category: Capacitors - MLCC; Supplier Part Number 1: C710862; Tolerance: ±20%; Voltage Rating: 6.3V; Temperature Coefficient: X7S; RoHS: Yes; ComponentLink1Description: Datasheet; ComponentLink1URL: https://wmsc.lcsc.com/wmsc/upload/file/pdf/v2/lcsc/2210190600_Murata-Electronics-GRM155C70J225ME11D_C710862.pdf; ComponentLink2Description: JLCPCB Part URL; ComponentLink2URL: https://jlcpcb.com/partdetail/C710862; ComponentLink3Description: LCSC Part URL; ComponentLink3URL: https://lcsc.com/product-detail/Multilayer-Ceramic-Capacitors-MLCC---SMD-SMT_Murata-Electronics-Murata-Electronics-GRM155C70J225ME11D_C710862.html
footprint CAP-0402 (0402 (1005M) Capacitor)
pins: 1, 2

## GRM155C71A105KE11D
designator C?  Capacitance: 1uF  (hidden comment: *)
Capacitor, Ceramic (MLCC), 1uF, ±10%, 10V, X7S, ±10%, SMD 0402; Manufacturer: Murata Electronics; Manufacturer Part Number: GRM155C71A105KE11D; Package Size: 0402; JLCPCB Basic Part: No; JLCPCB Part Number: C437522; Supplier 1: LCSC; Category: Capacitors - MLCC; Supplier Part Number 1: C437522; Tolerance: ±10%; Voltage Rating: 10V; Temperature Coefficient: X7S; RoHS: Yes; ComponentLink1Description: Datasheet; ComponentLink1URL: https://wmsc.lcsc.com/wmsc/upload/file/pdf/v2/lcsc/2304140030_Murata-Electronics-GRM155C71A105KE11D_C437522.pdf; ComponentLink2Description: JLCPCB Part URL; ComponentLink2URL: https://jlcpcb.com/partdetail/C437522; ComponentLink3Description: LCSC Part URL; ComponentLink3URL: https://lcsc.com/product-detail/Multilayer-Ceramic-Capacitors-MLCC---SMD-SMT_Murata-Electronics-Murata-Electronics-GRM155C71A105KE11D_C437522.html
footprint CAP-0402 (0402 (1005M) Capacitor)
pins: 1, 2

## GRM155C71A225ME11D
designator C?  Capacitance: 2.2uF  (hidden comment: *)
Capacitor, Ceramic (MLCC), 2.2uF, ±20%, 10V, X7S, ±20%, SMD 0402; Manufacturer: Murata Electronics; Manufacturer Part Number: GRM155C71A225ME11D; Package Size: 0402; JLCPCB Basic Part: No; JLCPCB Part Number: C703103; Supplier 1: LCSC; Category: Capacitors - MLCC; Supplier Part Number 1: C703103; Tolerance: ±20%; Voltage Rating: 10V; Temperature Coefficient: X7S; RoHS: Yes; ComponentLink1Description: Datasheet; ComponentLink1URL: https://wmsc.lcsc.com/wmsc/upload/file/pdf/v2/lcsc/2304140030_Murata-Electronics-GRM155C71A225ME11D_C703103.pdf; ComponentLink2Description: JLCPCB Part URL; ComponentLink2URL: https://jlcpcb.com/partdetail/C703103; ComponentLink3Description: LCSC Part URL; ComponentLink3URL: https://lcsc.com/product-detail/Multilayer-Ceramic-Capacitors-MLCC---SMD-SMT_Murata-Electronics-Murata-Electronics-GRM155C71A225ME11D_C703103.html
footprint CAP-0402 (0402 (1005M) Capacitor)
pins: 1, 2

## GRM155C71H104JE19D
designator C?  Capacitance: 100nF  (hidden comment: *)
Capacitor, Ceramic (MLCC), 100nF, ±5%, 50V, X7S, ±5%, SMD 0402; Manufacturer: Murata Electronics; Manufacturer Part Number: GRM155C71H104JE19D; Package Size: 0402; JLCPCB Basic Part: No; JLCPCB Part Number: C2189775; Supplier 1: LCSC; Category: Capacitors - MLCC; Supplier Part Number 1: C2189775; Tolerance: ±5%; Voltage Rating: 50V; Temperature Coefficient: X7S; RoHS: Yes; ComponentLink1Description: Datasheet; ComponentLink1URL: https://wmsc.lcsc.com/wmsc/upload/file/pdf/v2/lcsc/2202041900_Murata-Electronics-GRM155C71H104JE19D_C2189775.pdf; ComponentLink2Description: JLCPCB Part URL; ComponentLink2URL: https://jlcpcb.com/partdetail/C2189775; ComponentLink3Description: LCSC Part URL; ComponentLink3URL: https://lcsc.com/product-detail/Multilayer-Ceramic-Capacitors-MLCC---SMD-SMT_Murata-Electronics-Murata-Electronics-GRM155C71H104JE19D_C2189775.html
footprint CAP-0402 (0402 (1005M) Capacitor)
pins: 1, 2

## GRM155C71H104KE19D
designator C?  Capacitance: 100nF  (hidden comment: *)
Capacitor, Ceramic (MLCC), 100nF, ±10%, null, X7S, ±10%, SMD 0402; Manufacturer: Murata Electronics; Manufacturer Part Number: GRM155C71H104KE19D; Package Size: 0402; JLCPCB Basic Part: No; JLCPCB Part Number: C913614; Supplier 1: LCSC; Category: Capacitors - MLCC; Supplier Part Number 1: C913614; Tolerance: ±10%; Voltage Rating: null; Temperature Coefficient: X7S; RoHS: Yes; ComponentLink1Description: Datasheet; ComponentLink1URL: https://wmsc.lcsc.com/wmsc/upload/file/pdf/v2/lcsc/2201131300_Murata-Electronics-GRM155C71H104KE19D_C913614.pdf; ComponentLink2Description: JLCPCB Part URL; ComponentLink2URL: https://jlcpcb.com/partdetail/C913614; ComponentLink3Description: LCSC Part URL; ComponentLink3URL: https://lcsc.com/product-detail/Multilayer-Ceramic-Capacitors-MLCC---SMD-SMT_Murata-Electronics-Murata-Electronics-GRM155C71H104KE19D_C913614.html
footprint CAP-0402 (0402 (1005M) Capacitor)
pins: 1, 2

## GRM155C71H473KE19D
designator C?  Capacitance: 47nF  (hidden comment: *)
Capacitor, Ceramic (MLCC), 47nF, ±10%, null, X7S, ±10%, SMD 0402; Manufacturer: Murata Electronics; Manufacturer Part Number: GRM155C71H473KE19D; Package Size: 0402; JLCPCB Basic Part: No; JLCPCB Part Number: C701280; Supplier 1: LCSC; Category: Capacitors - MLCC; Supplier Part Number 1: C701280; Tolerance: ±10%; Voltage Rating: null; Temperature Coefficient: X7S; RoHS: Yes; ComponentLink1Description: Datasheet; ComponentLink1URL: https://wmsc.lcsc.com/wmsc/upload/file/pdf/v2/lcsc/2304140030_Murata-Electronics-GRM155C71H473KE19D_C701280.pdf; ComponentLink2Description: JLCPCB Part URL; ComponentLink2URL: https://jlcpcb.com/partdetail/C701280; ComponentLink3Description: LCSC Part URL; ComponentLink3URL: https://lcsc.com/product-detail/Multilayer-Ceramic-Capacitors-MLCC---SMD-SMT_Murata-Electronics-Murata-Electronics-GRM155C71H473KE19D_C701280.html
footprint CAP-0402 (0402 (1005M) Capacitor)
pins: 1, 2

## GRM155C80E226ME11D
designator C?  Capacitance: 22uF  (hidden comment: *)
Capacitor, Ceramic (MLCC), 22uF, ±20%, 2.5V, X6S, ±20%, SMD 0402; Manufacturer: Murata Electronics; Manufacturer Part Number: GRM155C80E226ME11D; Package Size: 0402; JLCPCB Basic Part: No; JLCPCB Part Number: C907955; Supplier 1: LCSC; Category: Capacitors - MLCC; Supplier Part Number 1: C907955; Tolerance: ±20%; Voltage Rating: 2.5V; Temperature Coefficient: X6S; RoHS: Yes; ComponentLink1Description: Datasheet; ComponentLink1URL: https://wmsc.lcsc.com/wmsc/upload/file/pdf/v2/lcsc/2201242100_Murata-Electronics-GRM155C80E226ME11D_C907955.pdf; ComponentLink2Description: JLCPCB Part URL; ComponentLink2URL: https://jlcpcb.com/partdetail/C907955; ComponentLink3Description: LCSC Part URL; ComponentLink3URL: https://lcsc.com/product-detail/Multilayer-Ceramic-Capacitors-MLCC---SMD-SMT_Murata-Electronics-Murata-Electronics-GRM155C80E226ME11D_C907955.html
footprint CAP-0402 (0402 (1005M) Capacitor)
pins: 1, 2

## GRM155C80G684KE19D
designator C?  Capacitance: 680nF  (hidden comment: *)
Capacitor, Ceramic (MLCC), 680nF, ±10%, 4V, X6S, ±10%, SMD 0402; Manufacturer: Murata Electronics; Manufacturer Part Number: GRM155C80G684KE19D; Package Size: 0402; JLCPCB Basic Part: No; JLCPCB Part Number: C162157; Supplier 1: LCSC; Category: Capacitors - MLCC; Supplier Part Number 1: C162157; Tolerance: ±10%; Voltage Rating: 4V; Temperature Coefficient: X6S; RoHS: Yes; ComponentLink1Description: Datasheet; ComponentLink1URL: https://wmsc.lcsc.com/wmsc/upload/file/pdf/v2/lcsc/1811081544_Murata-Electronics-GRM155C80G684KE19D_C162157.pdf; ComponentLink2Description: JLCPCB Part URL; ComponentLink2URL: https://jlcpcb.com/partdetail/C162157; ComponentLink3Description: LCSC Part URL; ComponentLink3URL: https://lcsc.com/product-detail/Multilayer-Ceramic-Capacitors-MLCC---SMD-SMT_Murata-Electronics-Murata-Electronics-GRM155C80G684KE19D_C162157.html
footprint CAP-0402 (0402 (1005M) Capacitor)
pins: 1, 2
